# Altium footprint library myPCBLib.PcbLib: 113 footprints (part 1 of 8)
Each footprint in its own frame and in the unit in brackets; x right, y up, seen from the top. Pads: shape width x height; smd on the part's side, far side on the other; paste and mask are expansions set on the pad; w line width, h text height; cw(c..) or ccw(c..) is an arc to the next point about the centre after c.
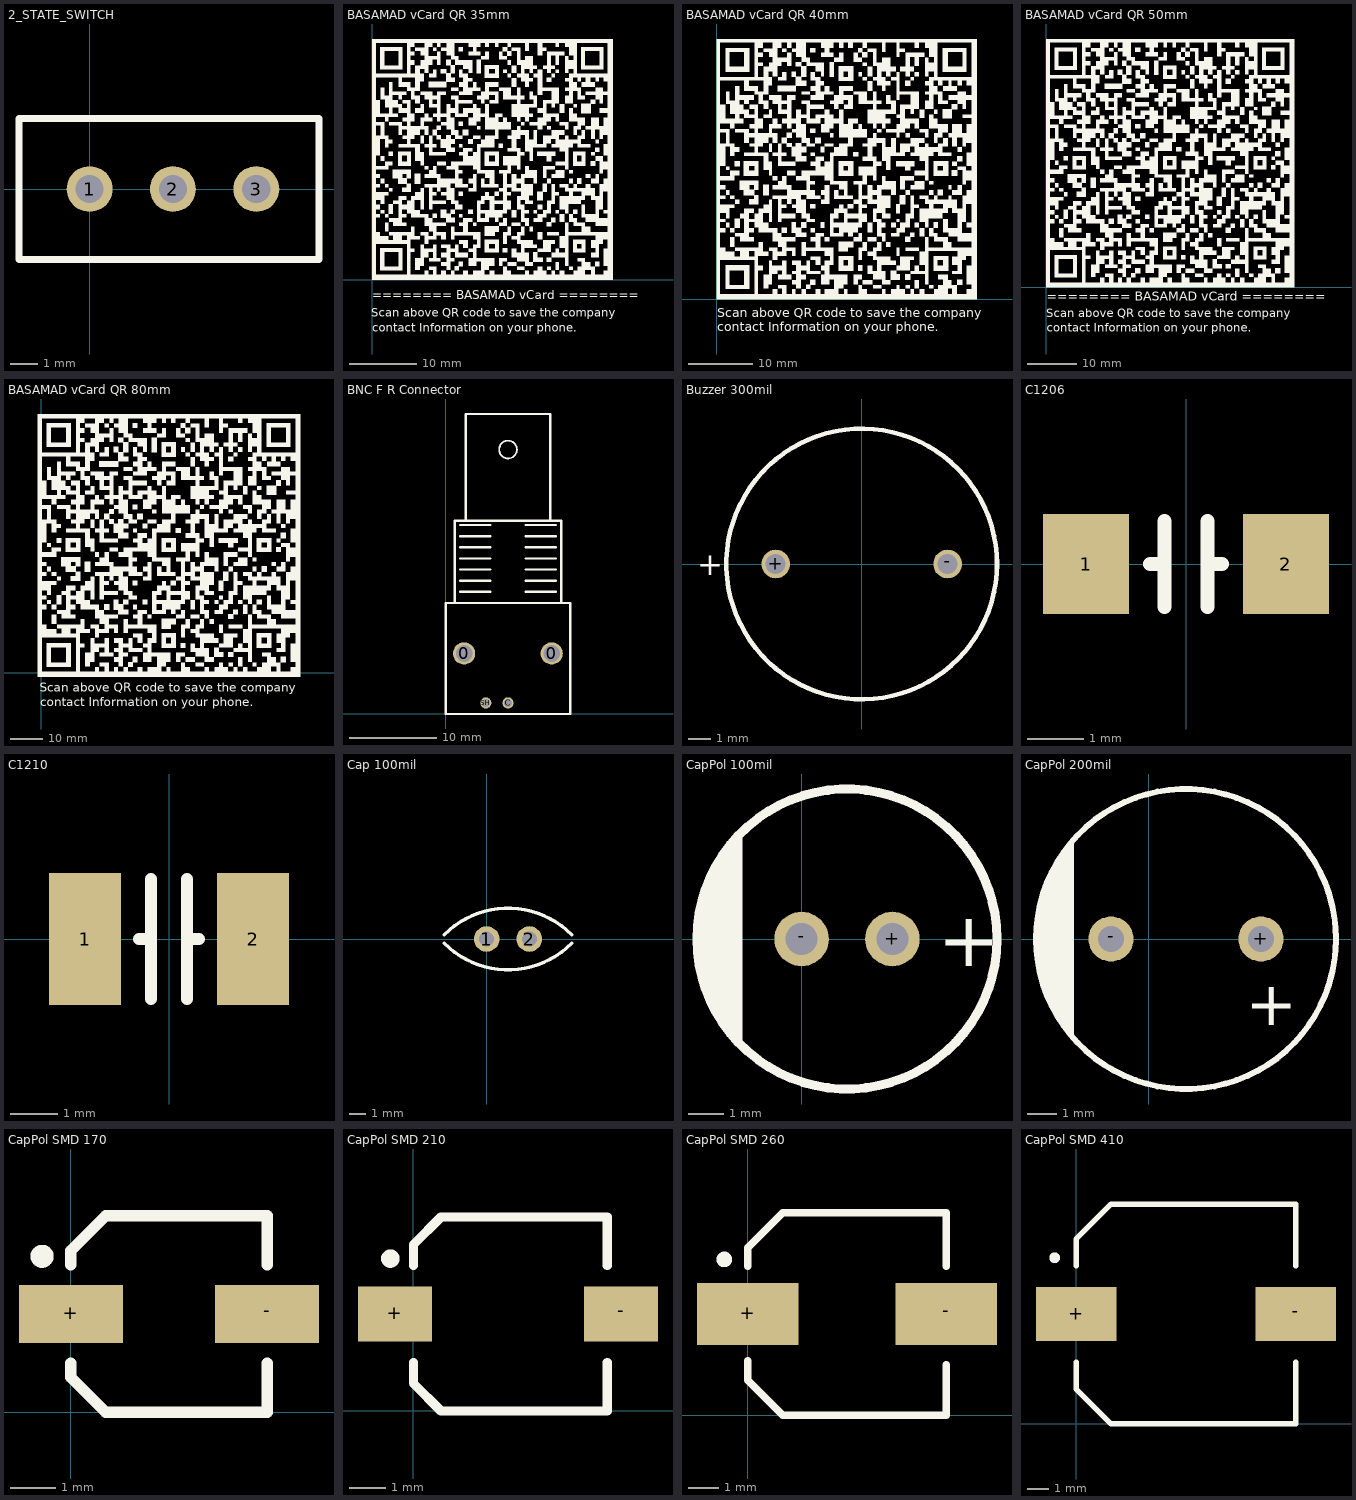
[diagram p0: the footprints below, top view; thin cyan lines are the x and y axes]

## 2_STATE_SWITCH [mil]
pads (3):
  round 65 hole 40: 1(0,0) 2(118.11,0) 3(236.22,0)
Top Overlay:
  lines w10: -100,-100 325,-100 325,100 -100,100 -100,-100

## BASAMAD vCard QR 35mm [mil]
Top Overlay:
  drawing of 51 lines, arcs and shapes, not listed
  text "contact Information on your phone." at 0,-318.9 h82.68
  text "Scan above QR code to save the company" at -3.94,-232.28 h82.68
  text "======== BASAMAD vCard ========" at 1.06,-129.45 h88.58

## BASAMAD vCard QR 40mm [mil]
Top Overlay:
  drawing of 51 lines, arcs and shapes, not listed
  text "Scan above QR code to save the company" at 3.94,-129.92 h94.49
  text "contact Information on your phone." at 3.94,-216.54 h94.49

## BASAMAD vCard QR 50mm [mil]
Top Overlay:
  drawing of 51 lines, arcs and shapes, not listed
  text "======== BASAMAD vCard ========" at 5,-133.39 h125.98
  text "Scan above QR code to save the company" at 0,-267.72 h118.11
  text "contact Information on your phone." at 3.94,-381.89 h118.11

## BASAMAD vCard QR 80mm [mil]
Top Overlay:
  drawing of 51 lines, arcs and shapes, not listed
  text "Scan above QR code to save the company" at -19.68,-263.78 h185.04
  text "contact Information on your phone." at -11.81,-444.88 h185.04

## BNC F R Connector [mil] "BNC (RJ59) Female Right Onboard Connector"
pads (4):
  round 100 hole 75: 0(82.5,272.5) 0(476.5,272.5)
  round 50 hole 35: C(280,50) SH(180,50)
Top Overlay:
  circle w8: c280,1190 r40
  lines w10: 40,500 40,870 120,870 385,870 505,870 520,870 520,500 ; 65,550 200,550 ; 65,600 200,600 ; 65,650 200,650 ; 65,700 200,700 ; 65,750 200,750 ; 65,800 200,800 ; 65,850 200,850 ; 90,870 90,1350 200,1350 470,1350 470,870 ; 360,550 495,550 ; 360,600 495,600 ; 360,650 495,650 ; 360,700 495,700 ; 360,750 495,750 ; 360,800 495,800 ; 360,850 495,850 ; 0,0 0,35 0,500 560,500 560,20 560,0 280,0 0,0

## Buzzer 300mil [mil]
pads (2):
  round 50 hole 35: +(-150,0) -(150,0)
Top Overlay:
  circle w8: c0,0 r236.22
  text "+" at -287.4,-19.68 h39.37

## C1206 [mil]
pads (2):
  rect 60x70 smd: 1(-70,0) 2(70,0)
Top Overlay:
  lines w10: -25,0 -15,0 ; -15,-30 -15,30 ; 15,-30 15,30 ; 15,0 25,0

## C1210 [mil]
pads (2):
  rect 60x110 smd: 1(-70,0) 2(70,0)
Top Overlay:
  lines w10: -25,0 -15,0 ; -15,-50 -15,50 ; 15,-50 15,50 ; 15,0 25,0

## Cap 100mil [mil]
pads (2):
  round 60 hole 35: 1(0,0) 2(100,0)
Top Overlay:
  lines w8: -100,-10 ccw(c50,140) 200,-10 ; -100,10 cw(c50,-140) 200,10

## CapPol 100mil [mil]
pads (2):
  round 60 hole 35: +(100,0) -(0,0)
Top Overlay:
  circle w10: c50,0 r165
  region: -65,115 -65,-115 -85,-95 -105,-60 -115,-25 -115,25 -105,55 -85,95
  text "+" at 150,-30 h60

## CapPol 200mil [mil]
pads (2):
  round 60 hole 35: +(150,0) -(-50,0)
Top Overlay:
  circle w8: c50,0 r200
  region: -100,135 -100,-130 -110,-120 -120,-105 -140,-65 -150,-27.5 -150,22.5 -140,70 -120,105
  text "+" at 130,-115 h60

## CapPol SMD 170 [mil]
pads (2):
  rect 90x50 smd: +(0,85) -(170,85)
Top Overlay:
  circle w10: c-25,135 r5
  lines w10: 0,42.5 0,30 30,0 170,0 170,42.5 ; 0,127.5 0,140 30,170 170,170 170,127.5

## CapPol SMD 210 [mil]
pads (2):
  rect 80x60 smd: +(-20,105) -(225,105)
Top Overlay:
  circle w10: c-25,165 r5
  lines w10: 0,52.5 0,30 30,0 210,0 210,52.5 ; 0,157.5 0,180 30,210 210,210 210,157.5

## CapPol SMD 260 [mil]
pads (2):
  rect 130x80 smd: +(0,130) -(255,130)
Top Overlay:
  circle w10: c-30,200 r5
  lines w10: 0,70 0,45 45,0 255,0 255,65 ; 0,191.25 0,215 45,260 255,260 255,191.25

## CapPol SMD 410 [mil]
pads (2):
  rect 150x100 smd: +(0,205) -(410,205)
Top Overlay:
  circle w10: c-40,310 r5
  lines w10: 0,115 0,65 65,0 410,0 410,115 ; 0,295 0,345 65,410 410,410 410,295